# Altium footprint library Miscellaneous SMD.PcbLib: 82 footprints (part 1 of 7) (continued)
## AVX_24 5602 040 000 829 [mm] "40 Contacts, Fine Pitch 0.4mm, Surface Mount, Board to Board Receptacle Connector, 5602 Series"
height 1.45
pads (42):
  rect 0.23x1 smd: 1(-3.8,2.25) 2(-3.4,2.25) 3(-3,2.25) 4(-2.6,2.25) 5(-2.2,2.25) 6(-1.8,2.25) 7(-1.4,2.25) 8(-1,2.25) 9(-0.6,2.25) 10(-0.2,2.25) 11(0.2,2.25) 12(0.6,2.25) 13(1,2.25) 14(1.4,2.25) 15(1.8,2.25) 16(2.2,2.25) 17(2.6,2.25) 18(3,2.25) 19(3.4,2.25) 20(3.8,2.25) 21(3.8,-2.25) 22(3.4,-2.25) 23(3,-2.25) 24(2.6,-2.25) 25(2.2,-2.25) 26(1.8,-2.25) 27(1.4,-2.25) 28(1,-2.25) 29(0.6,-2.25) 30(0.2,-2.25) 31(-0.2,-2.25) 32(-0.6,-2.25) 33(-1,-2.25) 34(-1.4,-2.25) 35(-1.8,-2.25) 36(-2.2,-2.25) 37(-2.6,-2.25) 38(-3,-2.25) 39(-3.4,-2.25) 40(-3.8,-2.25)
  round 0.5 hole 0.65 unplated mask+0.075: 41(4.6,0.9) 42(-4.6,-0.9)
Top Overlay:
  circle w0.25: c-4.5,2.475 r0.125
  lines w0.2: -5.05,-1.403 -5.05,-2 -4.315,-2 ; -5.05,-0.397 -5.05,2 -4.315,2 ; -4.65,-0.227 -4.65,1.14 3.969,1.14 ; -3.969,-1.14 4.65,-1.14 4.65,0.227 ; 4.315,-2 5.05,-2 5.05,0.397 ; 4.315,2 5.05,2 5.05,1.403 ; -3.915,-0.65 -3.915,0.65 3.915,0.65 3.915,-0.65 -3.915,-0.65
Mechanical 8:
  drawing of 252 lines, arcs and shapes, not listed
Mechanical 14:
  circle w0.25: c-4.5,2.475 r0.125
  lines w0.1: -3.885,-2 -3.885,-2.5 -3.715,-2.5 -3.715,-2 ; -3.885,2 -3.885,2.5 -3.715,2.5 -3.715,2 ; -3.485,-2 -3.485,-2.5 -3.315,-2.5 -3.315,-2 ; -3.485,2 -3.485,2.5 -3.315,2.5 -3.315,2 ; -3.085,-2 -3.085,-2.5 -2.915,-2.5 -2.915,-2 ; -3.085,2 -3.085,2.5 -2.915,2.5 -2.915,2 ; -2.685,-2 -2.685,-2.5 -2.515,-2.5 -2.515,-2 ; -2.685,2 -2.685,2.5 -2.515,2.5 -2.515,2 ; -2.285,-2 -2.285,-2.5 -2.115,-2.5 -2.115,-2 ; -2.285,2 -2.285,2.5 -2.115,2.5 -2.115,2 ; -1.885,-2 -1.885,-2.5 -1.715,-2.5 -1.715,-2 ; -1.885,2 -1.885,2.5 -1.715,2.5 -1.715,2 ; -1.485,-2 -1.485,-2.5 -1.315,-2.5 -1.315,-2 ; -1.485,2 -1.485,2.5 -1.315,2.5 -1.315,2 ; -1.085,-2 -1.085,-2.5 -0.915,-2.5 -0.915,-2 ; -1.085,2 -1.085,2.5 -0.915,2.5 -0.915,2 ; -0.685,-2 -0.685,-2.5 -0.515,-2.5 -0.515,-2 ; -0.685,2 -0.685,2.5 -0.515,2.5 -0.515,2 ; -0.285,-2 -0.285,-2.5 -0.115,-2.5 -0.115,-2 ; -0.285,2 -0.285,2.5 -0.115,2.5 -0.115,2 ; 0.115,-2 0.115,-2.5 0.285,-2.5 0.285,-2 ; 0.115,2 0.115,2.5 0.285,2.5 0.285,2 ; 0.515,-2 0.515,-2.5 0.685,-2.5 0.685,-2 ; 0.515,2 0.515,2.5 0.685,2.5 0.685,2 ; 0.915,-2 0.915,-2.5 1.085,-2.5 1.085,-2 ; 0.915,2 0.915,2.5 1.085,2.5 1.085,2 ; 1.315,-2 1.315,-2.5 1.485,-2.5 1.485,-2 ; 1.315,2 1.315,2.5 1.485,2.5 1.485,2 ; 1.715,-2 1.715,-2.5 1.885,-2.5 1.885,-2 ; 1.715,2 1.715,2.5 1.885,2.5 1.885,2 ; 2.115,-2 2.115,-2.5 2.285,-2.5 2.285,-2 ; 2.115,2 2.115,2.5 2.285,2.5 2.285,2 ; 2.515,-2 2.515,-2.5 2.685,-2.5 2.685,-2 ; 2.515,2 2.515,2.5 2.685,2.5 2.685,2 ; 2.915,-2 2.915,-2.5 3.085,-2.5 3.085,-2 ; 2.915,2 2.915,2.5 3.085,2.5 3.085,2 ; 3.315,-2 3.315,-2.5 3.485,-2.5 3.485,-2 ; 3.315,2 3.315,2.5 3.485,2.5 3.485,2 ; 3.715,-2 3.715,-2.5 3.885,-2.5 3.885,-2 ; 3.715,2 3.715,2.5 3.885,2.5 3.885,2 ; -5.05,-2 -5.05,2 5.05,2 5.05,-2 -5.05,-2 ; -4.65,-1.14 -4.65,1.14 4.65,1.14 4.65,-1.14 -4.65,-1.14 ; -3.915,-0.65 -3.915,0.65 3.915,0.65 3.915,-0.65 -3.915,-0.65
Mechanical 15:
  lines w0.05: -5.3,-3 -5.3,3 5.3,3 5.3,-3 -5.3,-3
3D body "AVX_24 5602 040 000 829.stp": height 1.45, standoff -0.45, extent -5.05,-2.5 5.05,2.5

## CINCH_142-0701-851 [mil] "SMA End Launch Straight Bulkhead Jack Receptacle - Tab Contact"
height 311.81
pads (5):
  rect 200x90 smd: 1(0,0)
  rect 200x95 smd: 2(0,-172.5) 2(0,172.5)
  rect 200x95 smd far side: 2(0,-172.5) 2(0,172.5)
Top Overlay:
  lines w7.87: -172.83,-110.24 -184.65,-98.43 ; -172.83,110.24 -184.65,98.43 ; -113.78,-187.4 -172.83,-187.4 -172.83,187.4 -113.78,187.4 ; -107.87,-111.22 -107.87,-58.78 ; -107.87,58.78 -107.87,111.22 ; -462.2,-107.09 -462.2,107.09 ; -462.2,-107.09 -452.32,-121.26 ; -462.2,-107.09 -481.89,-107.09 -481.89,107.09 -462.2,107.09 ; -462.2,107.09 -452.32,121.26 ; -452.31,-121.24 -452.31,121.26 ; -452.32,-121.26 -442.39,-104.13 ; -452.32,121.26 -442.39,104.13 ; -442.39,-104.13 -442.39,104.13 ; -442.39,-104.13 -432.47,-121.26 ; -442.39,104.13 -432.47,121.26 ; -432.47,-121.26 -432.47,121.26 ; -432.47,-121.26 -422.55,-104.13 ; -432.47,121.26 -422.55,104.13 ; -422.55,-104.13 -422.55,104.13 ; -422.55,-104.13 -412.62,-121.26 ; -422.55,104.13 -412.62,121.26 ; -412.62,-121.26 -412.62,121.26 ; -412.62,-121.26 -402.7,-104.13 ; -412.62,121.26 -402.7,104.13 ; -402.7,-104.13 -402.7,104.13 ; -402.7,-104.13 -392.78,-121.26 ; -402.7,104.13 -392.78,121.26 ; -392.78,-121.26 -392.78,121.26 ; -392.78,-121.26 -382.86,-104.13 ; -392.78,121.26 -382.86,104.13 ; -382.86,-104.13 -382.86,104.13 ; -382.86,-104.13 -372.94,-121.26 ; -382.86,104.13 -372.94,121.26 ; -372.94,-121.26 -372.94,121.26 ; -372.94,-121.26 -363.02,-104.13 ; -372.94,121.26 -363.02,104.13 ; -363.02,-104.13 -363.02,104.13 ; -363.02,-104.13 -353.1,-121.26 ; -363.02,104.13 -353.1,121.26 ; -353.1,-121.26 -353.1,121.26 ; -353.1,-121.26 -343.18,-104.13 ; -353.1,121.26 -343.18,104.13 ; -343.18,-104.13 -343.18,104.13 ; -343.18,-104.13 -333.25,-121.26 ; -343.18,104.13 -333.25,121.26 ; -333.25,-121.26 -333.25,121.26 ; -333.25,-121.26 -323.33,-104.13 ; -333.25,121.26 -323.33,104.13 ; -323.33,-104.13 -323.33,104.13 ; -323.33,-104.13 -313.41,-121.26 ; -323.33,104.13 -313.41,121.26 ; -313.41,-121.26 -303.49,-104.13 -297.64,-98.43 ; -313.41,-121.26 -313.41,121.26 ; -313.41,121.26 -303.49,104.13 -297.64,98.43 ; -297.64,-98.43 -184.65,-98.43 ; -297.64,-98.43 -297.64,98.43 ; -297.64,98.43 -184.65,98.43 ; -184.65,-98.43 -184.65,98.43
Mechanical 8:
  circle w3.94: c135.43,172.5 r27.56
  circle w3.94: c135.43,172.5 r17.72
  circle w3.94: c135.43,-172.5 r27.56
  circle w3.94: c135.43,-172.5 r17.72
  lines w3.94: -127.56,0 -107.87,0 ; -107.87,-19.68 -107.87,0 ; -107.87,19.68 -107.87,0 ; -88.19,0 -107.87,0 ; -19.68,-172.5 0,-172.5 ; -19.68,0 0,0 ; -19.68,172.5 0,172.5 ; 0,-192.19 0,-172.5 ; 0,-152.81 0,-172.5 ; 0,-19.68 0,0 ; 0,19.68 0,0 ; 0,152.81 0,172.5 ; 0,192.19 0,172.5 ; 19.68,-172.5 0,-172.5 ; 19.68,0 0,0 ; 19.68,172.5 0,172.5 ; 100,-172.5 135.43,-172.5 ; 100,172.5 135.43,172.5 ; -100,-220 -100,-125 100,-125 100,-220 -100,-220 ; -100,-45 -100,45 100,45 100,-45 -100,-45 ; -100,125 100,125 100,220 -100,220 -100,125
Mechanical 14:
  lines w3.94: -172.83,-110.24 -184.65,-98.43 ; -172.83,110.24 -184.65,98.43 ; -107.87,-187.4 -107.87,187.4 ; -107.87,-148.03 79.13,-148.03 79.13,-187.4 -172.83,-187.4 -172.83,187.4 79.13,187.4 79.13,148.03 -107.87,148.03 ; -107.87,-10.04 -32.87,-10.04 -32.87,10.04 -107.87,10.14 ; -462.2,-107.09 -462.2,107.09 ; -462.2,-107.09 -452.32,-121.26 ; -462.2,-107.09 -481.89,-107.09 -481.89,107.09 -462.2,107.09 ; -462.2,107.09 -452.32,121.26 ; -452.31,-121.24 -452.31,121.26 ; -452.32,-121.26 -442.39,-104.13 ; -452.32,121.26 -442.39,104.13 ; -442.39,-104.13 -442.39,104.13 ; -442.39,-104.13 -432.47,-121.26 ; -442.39,104.13 -432.47,121.26 ; -432.47,-121.26 -432.47,121.26 ; -432.47,-121.26 -422.55,-104.13 ; -432.47,121.26 -422.55,104.13 ; -422.55,-104.13 -422.55,104.13 ; -422.55,-104.13 -412.62,-121.26 ; -422.55,104.13 -412.62,121.26 ; -412.62,-121.26 -412.62,121.26 ; -412.62,-121.26 -402.7,-104.13 ; -412.62,121.26 -402.7,104.13 ; -402.7,-104.13 -402.7,104.13 ; -402.7,-104.13 -392.78,-121.26 ; -402.7,104.13 -392.78,121.26 ; -392.78,-121.26 -392.78,121.26 ; -392.78,-121.26 -382.86,-104.13 ; -392.78,121.26 -382.86,104.13 ; -382.86,-104.13 -382.86,104.13 ; -382.86,-104.13 -372.94,-121.26 ; -382.86,104.13 -372.94,121.26 ; -372.94,-121.26 -372.94,121.26 ; -372.94,-121.26 -363.02,-104.13 ; -372.94,121.26 -363.02,104.13 ; -363.02,-104.13 -363.02,104.13 ; -363.02,-104.13 -353.1,-121.26 ; -363.02,104.13 -353.1,121.26 ; -353.1,-121.26 -353.1,121.26 ; -353.1,-121.26 -343.18,-104.13 ; -353.1,121.26 -343.18,104.13 ; -343.18,-104.13 -343.18,104.13 ; -343.18,-104.13 -333.25,-121.26 ; -343.18,104.13 -333.25,121.26 ; -333.25,-121.26 -333.25,121.26 ; -333.25,-121.26 -323.33,-104.13 ; -333.25,121.26 -323.33,104.13 ; -323.33,-104.13 -323.33,104.13 ; -323.33,-104.13 -313.41,-121.26 ; -323.33,104.13 -313.41,121.26 ; -313.41,-121.26 -303.49,-104.13 -297.64,-98.43 ; -313.41,-121.26 -313.41,121.26 ; -313.41,121.26 -303.49,104.13 -297.64,98.43 ; -297.64,-98.43 -184.65,-98.43 ; -297.64,-98.43 -297.64,98.43 ; -297.64,98.43 -184.65,98.43 ; -184.65,-98.43 -184.65,98.43
3D body "CINCH_142-0701-851.stp": height 160.83, standoff -150.98, extent -481.88,-187.4 79.14,187.41

## CINCH_142-0761-801 [mm] "SMA 50 Ohm High Frequency End Launch SMA Jack Receptacle (10mil Pin)"
height 5.53
pads (7):
  rect 1.27x0.406 smd: 1(0,0)
  round 1.5 hole 1.1: 2(1.115,-1.219) 2(1.115,1.219) 2(3.325,-1.219) 2(3.325,1.219)
  rect 5.5x3.595 smd: 2(2.115,-2.253) 2(2.115,2.252)
Top Overlay:
  lines w0.2: -9.359,-2.5 -10.155,-2.5 -10.155,2.5 -9.359,2.5 -9.359,-2.51 -9.009,-3.11 -8.969,-3.11 -8.619,-2.51 -8.269,-3.11 -8.229,-3.11 -7.879,-2.51 -7.529,-3.11 -7.489,-3.11 -7.139,-2.51 -6.789,-3.11 -6.749,-3.11 -6.399,-2.51 -6.049,-3.11 -6.009,-3.11 -5.659,-2.51 -5.309,-3.11 -5.269,-3.11 -4.919,-2.51 -4.919,2.51 -5.269,3.11 -5.309,3.11 -5.659,2.51 -6.009,3.11 -6.049,3.11 -6.399,2.51 -6.749,3.11 -6.789,3.11 -7.139,2.51 -7.489,3.11 -7.529,3.11 -7.879,2.51 -8.229,3.11 -8.269,3.11 -8.619,2.51 -8.969,3.11 -9.009,3.11 -9.359,2.51 ; -8.989,-3.11 -8.989,3.11 ; -8.249,-3.11 -8.249,3.11 ; -7.509,-3.11 -7.509,3.11 ; -6.769,-3.11 -6.769,3.11 ; -6.029,-3.11 -6.029,3.11 ; -5.289,-3.11 -5.289,3.11 ; -4.919,-2.5 -2.92,-2.5 ; -4.919,2.5 -2.92,2.5 ; -2.655,-1.478 -0.935,-1.478 ; -2.655,1.477 -0.935,1.477 ; -0.935,-3.135 -2.655,-3.135 ; -0.935,3.135 -2.655,3.135 ; -2.92,-2.5 -2.655,-3.135 ; -2.92,-2.5 -2.92,2.5 ; -2.92,2.5 -2.655,3.135 ; -2.655,-3.135 -2.655,3.135
Mechanical 8:
  circle w0.1: c3.325,-1.219 r0.55
  circle w0.1: c1.115,-1.219 r0.55
  circle w0.1: c3.325,1.219 r0.55
  circle w0.1: c1.115,1.219 r0.55
  lines w0.1: -1.135,0 -0.635,0 ; -0.5,0 0,0 ; 0,-0.5 0,0 ; 0,0.5 0,0 ; 0.5,0 0,0 ; 0.615,-1.219 1.115,-1.219 ; 0.615,1.219 1.115,1.219 ; 1.115,-1.719 1.115,-1.219 ; 1.115,-0.719 1.115,-1.219 ; 1.115,0.719 1.115,1.219 ; 1.115,1.719 1.115,1.219 ; 1.615,-2.253 2.115,-2.253 ; 1.615,-1.219 1.115,-1.219 ; 1.615,1.219 1.115,1.219 ; 1.615,2.252 2.115,2.252 ; 2.115,-2.753 2.115,-2.253 ; 2.115,-1.753 2.115,-2.253 ; 2.115,1.752 2.115,2.252 ; 2.115,2.752 2.115,2.252 ; 2.615,-2.253 2.115,-2.253 ; 2.615,2.252 2.115,2.252 ; 2.825,-1.219 3.325,-1.219 ; 2.825,1.219 3.325,1.219 ; 3.325,-1.719 3.325,-1.219 ; 3.325,-0.719 3.325,-1.219 ; 3.325,0.719 3.325,1.219 ; 3.325,1.719 3.325,1.219 ; 3.825,-1.219 3.325,-1.219 ; 3.825,1.219 3.325,1.219 ; -0.635,-4.05 4.865,-4.05 4.865,-0.455 -0.635,-0.455 -0.635,-4.05 ; -0.635,-0.203 -0.635,0.203 0.635,0.203 0.635,-0.203 -0.635,-0.203 ; -0.635,0.455 4.865,0.455 4.865,4.05 -0.635,4.05 -0.635,0.455
Mechanical 14:
  lines w0.1: -9.359,-2.5 -10.155,-2.5 -10.155,2.5 -9.359,2.5 -9.359,-2.51 -9.009,-3.11 -8.969,-3.11 -8.619,-2.51 -8.269,-3.11 -8.229,-3.11 -7.879,-2.51 -7.529,-3.11 -7.489,-3.11 -7.139,-2.51 -6.789,-3.11 -6.749,-3.11 -6.399,-2.51 -6.049,-3.11 -6.009,-3.11 -5.659,-2.51 -5.309,-3.11 -5.269,-3.11 -4.919,-2.51 -4.919,2.51 -5.269,3.11 -5.309,3.11 -5.659,2.51 -6.009,3.11 -6.049,3.11 -6.399,2.51 -6.749,3.11 -6.789,3.11 -7.139,2.51 -7.489,3.11 -7.529,3.11 -7.879,2.51 -8.229,3.11 -8.269,3.11 -8.619,2.51 -8.969,3.11 -9.009,3.11 -9.359,2.51 ; -8.989,-3.11 -8.989,3.11 ; -8.249,-3.11 -8.249,3.11 ; -7.509,-3.11 -7.509,3.11 ; -6.769,-3.11 -6.769,3.11 ; -6.029,-3.11 -6.029,3.11 ; -5.289,-3.11 -5.289,3.11 ; -4.919,-2.5 -2.92,-2.5 ; -4.919,2.5 -2.92,2.5 ; -2.655,-1.478 -0.635,-1.478 ; -2.655,1.477 -0.635,1.477 ; -0.635,-0.635 3.905,-0.635 3.905,-3.135 -0.635,-3.135 ; -0.635,-0.6 -0.535,-0.6 -0.535,0.6 -0.635,0.6 ; -0.635,0.635 3.905,0.635 3.905,3.135 -0.635,3.135 ; -0.535,-0.127 0.125,-0.127 0.125,0.127 -0.535,0.127 ; -2.92,-2.5 -2.655,-3.135 ; -2.92,-2.5 -2.92,2.5 ; -2.92,2.5 -2.655,3.135 ; -2.655,-3.135 -0.635,-3.135 ; -2.655,-3.135 -2.655,3.135 ; -2.655,3.135 -0.635,3.135 ; -0.635,-3.135 -0.635,0 ; -0.635,0 -0.635,3.135 ; -0.635,0 -0.635,3.135
3D body "CINCH_142-0761-801.stp": height 3.3, standoff -2.92, extent -10.155,-3.134 3.905,3.134

## CINCH_142-0761-881 [mm] "SMA 50 Ohm High Frequency End Launch SMA Jack Receptacle (10mil Pin)"
height 5.53
pads (7):
  rect 1.27x0.406 smd: 1(0,0)
  round 1.5 hole 1.1: 2(1.115,-1.219) 2(1.115,1.219) 2(3.325,-1.219) 2(3.325,1.219)
  rect 5.5x3.595 smd: 2(2.115,-2.253) 2(2.115,2.252)
Top Overlay:
  lines w0.2: -9.359,-2.5 -10.155,-2.5 -10.155,2.5 -9.359,2.5 -9.359,-2.51 -9.009,-3.11 -8.969,-3.11 -8.619,-2.51 -8.269,-3.11 -8.229,-3.11 -7.879,-2.51 -7.529,-3.11 -7.489,-3.11 -7.139,-2.51 -6.789,-3.11 -6.749,-3.11 -6.399,-2.51 -6.049,-3.11 -6.009,-3.11 -5.659,-2.51 -5.309,-3.11 -5.269,-3.11 -4.919,-2.51 -4.919,2.51 -5.269,3.11 -5.309,3.11 -5.659,2.51 -6.009,3.11 -6.049,3.11 -6.399,2.51 -6.749,3.11 -6.789,3.11 -7.139,2.51 -7.489,3.11 -7.529,3.11 -7.879,2.51 -8.229,3.11 -8.269,3.11 -8.619,2.51 -8.969,3.11 -9.009,3.11 -9.359,2.51 ; -8.989,-3.11 -8.989,3.11 ; -8.249,-3.11 -8.249,3.11 ; -7.509,-3.11 -7.509,3.11 ; -6.769,-3.11 -6.769,3.11 ; -6.029,-3.11 -6.029,3.11 ; -5.289,-3.11 -5.289,3.11 ; -4.919,-2.5 -2.92,-2.5 ; -4.919,2.5 -2.92,2.5 ; -2.655,-1.478 -0.935,-1.478 ; -2.655,1.477 -0.935,1.477 ; -0.935,-3.135 -2.655,-3.135 ; -0.935,3.135 -2.655,3.135 ; -2.92,-2.5 -2.92,2.5 ; -2.92,-2.5 -2.655,-3.135 ; -2.92,2.5 -2.655,3.135 ; -2.655,-3.135 -2.655,3.135
Mechanical 8:
  circle w0.1: c1.115,1.219 r0.55
  circle w0.1: c3.325,1.219 r0.55
  circle w0.1: c1.115,-1.219 r0.55
  circle w0.1: c3.325,-1.219 r0.55
  lines w0.1: -1.135,0 -0.635,0 ; -0.5,0 0,0 ; 0,-0.5 0,0 ; 0,0.5 0,0 ; 0.5,0 0,0 ; 0.615,-1.219 1.115,-1.219 ; 0.615,1.219 1.115,1.219 ; 1.115,-1.719 1.115,-1.219 ; 1.115,-0.719 1.115,-1.219 ; 1.115,0.719 1.115,1.219 ; 1.115,1.719 1.115,1.219 ; 1.615,-2.253 2.115,-2.253 ; 1.615,-1.219 1.115,-1.219 ; 1.615,1.219 1.115,1.219 ; 1.615,2.252 2.115,2.252 ; 2.115,-2.753 2.115,-2.253 ; 2.115,-1.753 2.115,-2.253 ; 2.115,1.752 2.115,2.252 ; 2.115,2.752 2.115,2.252 ; 2.615,-2.253 2.115,-2.253 ; 2.615,2.252 2.115,2.252 ; 2.825,-1.219 3.325,-1.219 ; 2.825,1.219 3.325,1.219 ; 3.325,-1.719 3.325,-1.219 ; 3.325,-0.719 3.325,-1.219 ; 3.325,0.719 3.325,1.219 ; 3.325,1.719 3.325,1.219 ; 3.825,-1.219 3.325,-1.219 ; 3.825,1.219 3.325,1.219 ; -0.635,-4.05 -0.635,-0.455 4.865,-0.455 4.865,-4.05 -0.635,-4.05 ; -0.635,-0.203 0.635,-0.203 0.635,0.203 -0.635,0.203 -0.635,-0.203 ; -0.635,0.455 -0.635,4.05 4.865,4.05 4.865,0.455 -0.635,0.455
Mechanical 14:
  lines w0.1: -9.359,-2.5 -10.155,-2.5 -10.155,2.5 -9.359,2.5 -9.359,-2.51 -9.009,-3.11 -8.969,-3.11 -8.619,-2.51 -8.269,-3.11 -8.229,-3.11 -7.879,-2.51 -7.529,-3.11 -7.489,-3.11 -7.139,-2.51 -6.789,-3.11 -6.749,-3.11 -6.399,-2.51 -6.049,-3.11 -6.009,-3.11 -5.659,-2.51 -5.309,-3.11 -5.269,-3.11 -4.919,-2.51 -4.919,2.51 -5.269,3.11 -5.309,3.11 -5.659,2.51 -6.009,3.11 -6.049,3.11 -6.399,2.51 -6.749,3.11 -6.789,3.11 -7.139,2.51 -7.489,3.11 -7.529,3.11 -7.879,2.51 -8.229,3.11 -8.269,3.11 -8.619,2.51 -8.969,3.11 -9.009,3.11 -9.359,2.51 ; -8.989,-3.11 -8.989,3.11 ; -8.249,-3.11 -8.249,3.11 ; -7.509,-3.11 -7.509,3.11 ; -6.769,-3.11 -6.769,3.11 ; -6.029,-3.11 -6.029,3.11 ; -5.289,-3.11 -5.289,3.11 ; -4.919,-2.5 -2.92,-2.5 ; -4.919,2.5 -2.92,2.5 ; -2.655,-1.478 -0.635,-1.478 ; -2.655,1.477 -0.635,1.477 ; -0.635,-2.08 3.905,-2.08 ; -0.635,-0.635 3.905,-0.635 3.905,-3.135 -0.635,-3.135 ; -0.635,-0.6 -0.535,-0.6 -0.535,0.6 -0.635,0.6 ; -0.635,0.635 3.905,0.635 3.905,3.135 -0.635,3.135 ; -0.635,2.08 3.905,2.08 ; -0.535,-0.127 0.125,-0.127 0.125,0.127 -0.535,0.127 ; -2.92,-2.5 -2.92,2.5 ; -2.92,-2.5 -2.655,-3.135 ; -2.92,2.5 -2.655,3.135 ; -2.655,-3.135 -2.655,3.135 ; -2.655,-3.135 -0.635,-3.135 ; -2.655,3.135 -0.635,3.135 ; -0.635,-3.135 -0.635,0 ; -0.635,0 -0.635,3.135 ; -0.635,0 -0.635,3.135
3D body "CINCH_142-0761-881.stp": height 3.3, standoff -2.92, extent -10.155,-3.129 3.905,3.129

## DELTARF_2467-000-G91P-11 [mm] "50 Ohm Edge PCB Mount SSMC Bulkhead Jack Receptacle"
height 2.79
pads (4):
  rect 3.2x0.8 smd: 1(0,0)
  rect 3.2x1.2 smd: 2(0,-1.75) 2(0,1.75)
  rect 3.2x4.7 smd far side: 2(0,0)
Top Overlay:
  lines w0.2: -13.357,-1.257 -16.254,-1.257 -16.354,-1.157 -16.354,1.157 -16.254,1.257 -13.357,1.257 ; -6.967,-2.057 -6.755,-2.375 cw(c-3.537,-1.187) -6.755,0 -6.163,0 ; -6.967,2.057 -6.755,2.375 ccw(c-3.524,1.185) -6.757,0 ; -6.163,-2.375 -5.951,-2.057 ; -6.161,-2.37 ccw(c-9.379,-1.187) -6.163,0 ; -5.951,2.057 -6.163,2.375 cw(c-9.381,1.187) -6.163,0 ; -5.534,-1.71 -13.169,-1.71 ; -5.534,-1.392 -13.357,-1.392 ; -5.534,1.392 -13.357,1.392 ; -5.534,1.71 -13.169,1.71 -13.357,1.392 ; -3.451,-1.981 -3.451,1.954 ; -2.05,-1.981 -5.534,-1.981 -5.534,1.981 -2.05,1.981 ; -13.357,-1.392 -13.169,-1.71 ; -13.357,-1.392 -13.169,-1.71 ; -13.357,-1.392 -13.357,1.392 ; -6.967,-2.375 -6.967,2.375 -5.951,2.375 -5.951,-2.375 -6.967,-2.375
Mechanical 8:
  lines w0.1: -8.201,-0.513 -8.201,0.487 ; -7.847,-0.367 -8.201,-0.013 ; -7.847,0.34 -8.201,-0.013 ; -5.951,-0.5 -5.951,0.5 ; -5.597,-0.354 -5.951,0 ; -5.597,0.354 -5.951,0 ; -3.805,-0.354 -3.451,0 ; -3.805,0.354 -3.451,0 ; -3.451,-0.513 -3.451,0.487 ; -3.451,-0.013 -8.201,-0.013 ; -0.5,-1.75 0,-1.75 ; -0.5,0 0,0 ; -0.5,1.75 0,1.75 ; 0,-2.25 0,-1.75 ; 0,-1.25 0,-1.75 ; 0,-0.5 0,0 ; 0,0.5 0,0 ; 0,1.25 0,1.75 ; 0,2.25 0,1.75 ; 0.5,-1.75 0,-1.75 ; 0.5,0 0,0 ; 0.5,1.75 0,1.75 ; -5.951,0 -3.451,0 ; -1.6,-2.35 -1.6,2.35 ; -1.6,-2.35 1.6,-2.35 ; -1.6,-2.35 1.6,-2.35 ; -1.6,-2.35 -1.6,-1.15 1.6,-1.15 1.6,-2.35 ; -1.6,2.35 1.6,2.35 ; -1.6,2.35 1.6,2.35 ; -1.6,2.35 -1.6,1.15 1.6,1.15 1.6,2.35 ; 1.6,-2.35 1.6,2.35 ; -1.6,-0.4 1.6,-0.4 1.6,0.4 -1.6,0.4 -1.6,-0.4
  text "Maxi" at -8.4,-1.2 h0.8
  text "2.5mm" at -4.6,-1.7 h0.8
Mechanical 14:
  lines w0.1: -13.357,-1.257 -16.254,-1.257 -16.354,-1.157 -16.354,1.157 -16.254,1.257 -13.357,1.257 ; -6.967,-2.057 -6.755,-2.375 cw(c-3.537,-1.187) -6.755,0 -6.163,0 ; -6.967,2.057 -6.755,2.375 ccw(c-3.524,1.185) -6.757,0 ; -6.163,-2.375 -5.951,-2.057 ; -6.161,-2.37 ccw(c-9.379,-1.187) -6.163,0 ; -5.951,2.057 -6.163,2.375 cw(c-9.381,1.187) -6.163,0 ; -5.534,-1.71 -13.169,-1.71 ; -5.534,-1.392 -13.357,-1.392 ; -5.534,1.392 -13.357,1.392 ; -5.534,1.71 -13.169,1.71 -13.357,1.392 ; -3.451,-1.981 -3.451,1.954 ; -1.8,-1.981 -1.8,1.981 ; -1.8,-1.144 1.172,-1.144 1.172,-1.981 -5.534,-1.981 -5.534,1.981 1.172,1.981 1.172,1.144 -1.8,1.144 ; -1.8,-0.33 1.172,-0.33 1.172,0.33 -1.8,0.33 ; -13.357,-1.392 -13.169,-1.71 ; -13.357,-1.392 -13.169,-1.71 ; -13.357,-1.392 -13.357,1.392 ; -6.967,-2.375 -5.951,-2.375 -5.951,2.375 -6.967,2.375 -6.967,-2.375
3D body "DELTARF_2467-000-G91P-11_Part2.stp": height 3.2, standoff -2.28, extent -6.967,-2.375 -5.951,2.375
3D body "DELTARF_2467-000-G91P-11_Part1.stp": height 2.92, standoff -2.72, extent -16.354,-1.981 1.172,1.981

## EA_WF100-04S [mm] "4 Contact Picth 1mm, ZIF Connector For Touch Panel"
height 3
pads (6):
  rect 0.6x1.85 smd: 1(1.5,0) 2(0.5,0) 3(-0.5,0) 4(-1.5,0)
  rect 2.1x4.3 smd: 5(-4.95,-3.075) 6(4.95,-3.075)
Top Overlay:
  lines w0.2: -2.1,-0.325 -5.7,-0.325 -5.7,-6.125 5.7,-6.125 5.7,-0.325 2.1,-0.325
Mechanical 8:
  lines w0.1: -5.45,-3.075 -4.95,-3.075 ; -4.95,-3.575 -4.95,-3.075 ; -4.95,-2.575 -4.95,-3.075 ; -4.45,-3.075 -4.95,-3.075 ; -2,0 -1.5,0 ; -1.5,-0.5 -1.5,0 ; -1.5,0.5 -1.5,0 ; -1,0 -0.5,0 ; -0.5,-0.5 -0.5,0 ; -0.5,0.5 -0.5,0 ; 0,-0.5 0,0 ; 0,0.5 0,0 ; 0.5,-0.5 0.5,0 ; 0.5,0.5 0.5,0 ; 1,0 0.5,0 ; 1.5,-0.5 1.5,0 ; 1.5,0.5 1.5,0 ; 2,0 1.5,0 ; 4.45,-3.075 4.95,-3.075 ; 4.95,-3.575 4.95,-3.075 ; 4.95,-2.575 4.95,-3.075 ; 5.45,-3.075 4.95,-3.075 ; -0.5,0 0,0 ; 0,0 0.5,0 ; -6,-5.225 -6,-0.925 -3.9,-0.925 -3.9,-5.225 -6,-5.225 ; -1.8,-0.925 -1.8,0.925 -1.2,0.925 -1.2,-0.925 -1.8,-0.925 ; -0.8,-0.925 -0.8,0.925 -0.2,0.925 -0.2,-0.925 -0.8,-0.925 ; 0.2,-0.925 0.2,0.925 0.8,0.925 0.8,-0.925 0.2,-0.925 ; 1.2,-0.925 1.2,0.925 1.8,0.925 1.8,-0.925 1.2,-0.925 ; 3.9,-5.225 6,-5.225 6,-0.925 3.9,-0.925 3.9,-5.225
Mechanical 14:
  lines w0.1: -5.7,-6.125 -5.7,-0.325 5.7,-0.325 5.7,-6.125 -5.7,-6.125
Mechanical 15:
  lines w0.1: -6.25,-6.375 6.25,-6.375 6.25,1.175 -6.25,1.175 -6.25,-6.375
3D body: height 3, standoff 0, extent -5.7,-6.125 5.7,-0.325

## EDGE26T2B1_P254W3550L1020F140X1000 [mm] "26 contacts Board Eddge Connector, First Left Top Pad 2, First Left Bottom Pad 1Pitch 2.54mm Length 35.5mm, Width 10.2mm, Finger Lenght 10mm, Finger Witdth 1.4mm"
pads (26):
  rect 1.4x10 smd far side: 1(2.51,5.5) 3(5.05,5.5) 5(7.59,5.5) 7(10.13,5.5) 9(12.67,5.5) 11(15.21,5.5) 13(17.75,5.5) 15(20.29,5.5) 17(22.83,5.5) 19(25.37,5.5) 21(27.91,5.5) 23(30.45,5.5) 25(32.99,5.5)
  rect 1.4x10 smd: 2(2.51,5.5) 4(5.05,5.5) 6(7.59,5.5) 8(10.13,5.5) 10(12.67,5.5) 12(15.21,5.5) 14(17.75,5.5) 16(20.29,5.5) 18(22.83,5.5) 20(25.37,5.5) 22(27.91,5.5) 24(30.45,5.5) 26(32.99,5.5)
Top Overlay:
  text "26" at 33.58,11.225 h1.2
  text "2" at 3.1,11.225 h1.2
Bottom Overlay:
  text "25" at 32.38,11.35 h1.2
  text "1" at 1.9,11.35 h1.2
Top Solder:
  rectangle: 0,-2.275 35.5,10.5
  lines w2.54: -4.425,-1 32.99,-1
Bottom Solder:
  rectangle: 0,-2.275 35.5,10.5
  lines w2.54: -4.425,-1 32.99,-1
Keep-Out Layer:
  lines w0.305: -2.4,10.2 -1,10.2 cw(c-1,9.2) 0,9.2 0,1 ccw(c1,1) 1,0 34.5,0 ccw(c34.5,1) 35.5,1 35.5,9.2 cw(c36.5,9.2) 36.5,10.2 37.9,10.2
Mechanical 1:
  lines w1.27: -2.4,10.2 -1,10.2 cw(c-1,9.2) 0,9.2 0,1 ccw(c1,1) 1,0 34.5,0 ccw(c34.5,1) 35.5,1 35.5,9.2 cw(c36.5,9.2) 36.5,10.2 37.9,10.2
Corners:
  lines w0.1: -5,0 0,0 0,-5 ; 35.5,-5 35.5,0 40.5,0
Mechanical 8:
  lines w0.1: -5,0 0,0 0,-5 ; -5,10.2 -1,10.2 ; -3.8,0 -2.4,0 ; -3.8,10.2 -2.4,10.2 ; -2.742,0.94 -2.4,0 ; -2.742,9.26 -2.4,10.2 ; -2.058,0.94 -2.4,0 ; -2.058,9.26 -2.4,10.2 ; -1,0 -2.4,0 ; 0.94,8.458 0,8.8 ; 0.94,9.142 0,8.8 ; 34.56,8.458 35.5,8.8 ; 34.56,9.142 35.5,8.8 ; 35.5,-5 35.5,0 40.5,0 ; 40.5,10.2 36.5,10.2 ccw(c36.5,9.2) 35.5,9.2 ; -2.4,0 -2.4,10.2 ; -2.4,10.2 -1,10.2 ; -1,10.2 cw(c-1,9.2) 0,9.2 ; 0,8.8 35.5,8.8 ; 0,8.8 0,9.2 ; 0,9.2 0,1 ccw(c1,1) 1,0 34.5,0 ccw(c34.5,1) 35.5,1 35.5,9.2 ; 2.51,5.5 2.51,6 2.51,5.5 ; 2.51,5.5 2.51,5 2.51,5.5 ; 2.51,5.5 3.01,5.5 2.51,5.5 ; 2.51,5.5 2.01,5.5 2.51,5.5 ; 5.05,5.5 5.05,6 5.05,5.5 ; 5.05,5.5 5.05,5 5.05,5.5 ; 5.05,5.5 5.55,5.5 5.05,5.5 ; 5.05,5.5 4.55,5.5 5.05,5.5 ; 7.59,5.5 7.59,6 7.59,5.5 ; 7.59,5.5 7.59,5 7.59,5.5 ; 7.59,5.5 8.09,5.5 7.59,5.5 ; 7.59,5.5 7.09,5.5 7.59,5.5 ; 10.13,5.5 10.13,6 10.13,5.5 ; 10.13,5.5 10.13,5 10.13,5.5 ; 10.13,5.5 10.63,5.5 10.13,5.5 ; 10.13,5.5 9.63,5.5 10.13,5.5 ; 12.67,5.5 12.67,6 12.67,5.5 ; 12.67,5.5 12.67,5 12.67,5.5 ; 12.67,5.5 13.17,5.5 12.67,5.5 ; 12.67,5.5 12.17,5.5 12.67,5.5 ; 15.21,5.5 15.21,6 15.21,5.5 ; 15.21,5.5 15.21,5 15.21,5.5 ; 15.21,5.5 15.71,5.5 15.21,5.5 ; 15.21,5.5 14.71,5.5 15.21,5.5 ; 17.75,5.5 17.75,6 17.75,5.5 ; 17.75,5.5 17.75,5 17.75,5.5 ; 17.75,5.5 18.25,5.5 17.75,5.5 ; 17.75,5.5 17.25,5.5 17.75,5.5 ; 20.29,5.5 20.29,6 20.29,5.5 ; 20.29,5.5 20.29,5 20.29,5.5 ; 20.29,5.5 20.79,5.5 20.29,5.5 ; 20.29,5.5 19.79,5.5 20.29,5.5 ; 22.83,5.5 22.83,6 22.83,5.5 ; 22.83,5.5 22.83,5 22.83,5.5 ; 22.83,5.5 23.33,5.5 22.83,5.5 ; 22.83,5.5 22.33,5.5 22.83,5.5 ; 25.37,5.5 25.37,6 25.37,5.5 ; 25.37,5.5 25.37,5 25.37,5.5 ; 25.37,5.5 25.87,5.5 25.37,5.5 ; 25.37,5.5 24.87,5.5 25.37,5.5 ; 27.91,5.5 27.91,6 27.91,5.5 ; 27.91,5.5 27.91,5 27.91,5.5 ; 27.91,5.5 28.41,5.5 27.91,5.5 ; 27.91,5.5 27.41,5.5 27.91,5.5 ; 30.45,5.5 30.45,6 30.45,5.5 ; 30.45,5.5 30.45,5 30.45,5.5 ; 30.45,5.5 30.95,5.5 30.45,5.5 ; 30.45,5.5 29.95,5.5 30.45,5.5 ; 32.99,5.5 32.99,6 32.99,5.5 ; 32.99,5.5 32.99,5 32.99,5.5 ; 32.99,5.5 33.49,5.5 32.99,5.5 ; 32.99,5.5 32.49,5.5 32.99,5.5 ; 35.5,8.8 35.5,9.2
  text "35.5mm" at 15.3,9.45 h1.2
  text "10.2mm" at -3.125,1.425 h1.2
  text "All Pads  W 1.4mm x L 10mm" at 4.5,6.85 h1.2
Plating Frame:
  lines w0.305: 2.51,-1 2.51,5.5 ; 5.05,-1 5.05,5.5 ; 7.59,-1 7.59,5.5 ; 10.13,-1 10.13,5.5 ; 12.67,-1 12.67,5.5 ; 15.21,-1 15.21,5.5 ; 17.75,-1 17.75,5.5 ; 20.29,-1 20.29,5.5 ; 22.83,-1 22.83,5.5 ; 25.37,-1 25.37,5.5 ; 27.91,-1 27.91,5.5 ; 30.45,-1 30.45,5.5 ; 32.99,-1 32.99,5.5
  lines w2.54: -4.425,-1 32.99,-1
Drill Drawing:
  lines w0.1: -2.4,10.2 -1,10.2 cw(c-1,9.2) 0,9.2 0,7.8 ; 0,1 ccw(c1,1) 1,0 ; 18.125,1.737 33.762,1.737 35.25,0.25 ; 34.344,0.673 35.25,0.25 ; 34.5,0 ccw(c34.5,1) 35.5,1 ; 34.827,1.156 35.25,0.25 ; 35.5,7.8 35.5,9.2 cw(c36.5,9.2) 36.5,10.2 37.9,10.2
  text "4 x r = 1mm max" at 17.7,2.25 h1.2